# Altium footprint library MS-Electronic.PcbLib: 202 footprints (part 2 of 13)
Each footprint in its own frame and in the unit in brackets; x right, y up, seen from the top. Pads: shape width x height; smd on the part's side, far side on the other; paste and mask are expansions set on the pad; w line width, h text height; cw(c..) or ccw(c..) is an arc to the next point about the centre after c.
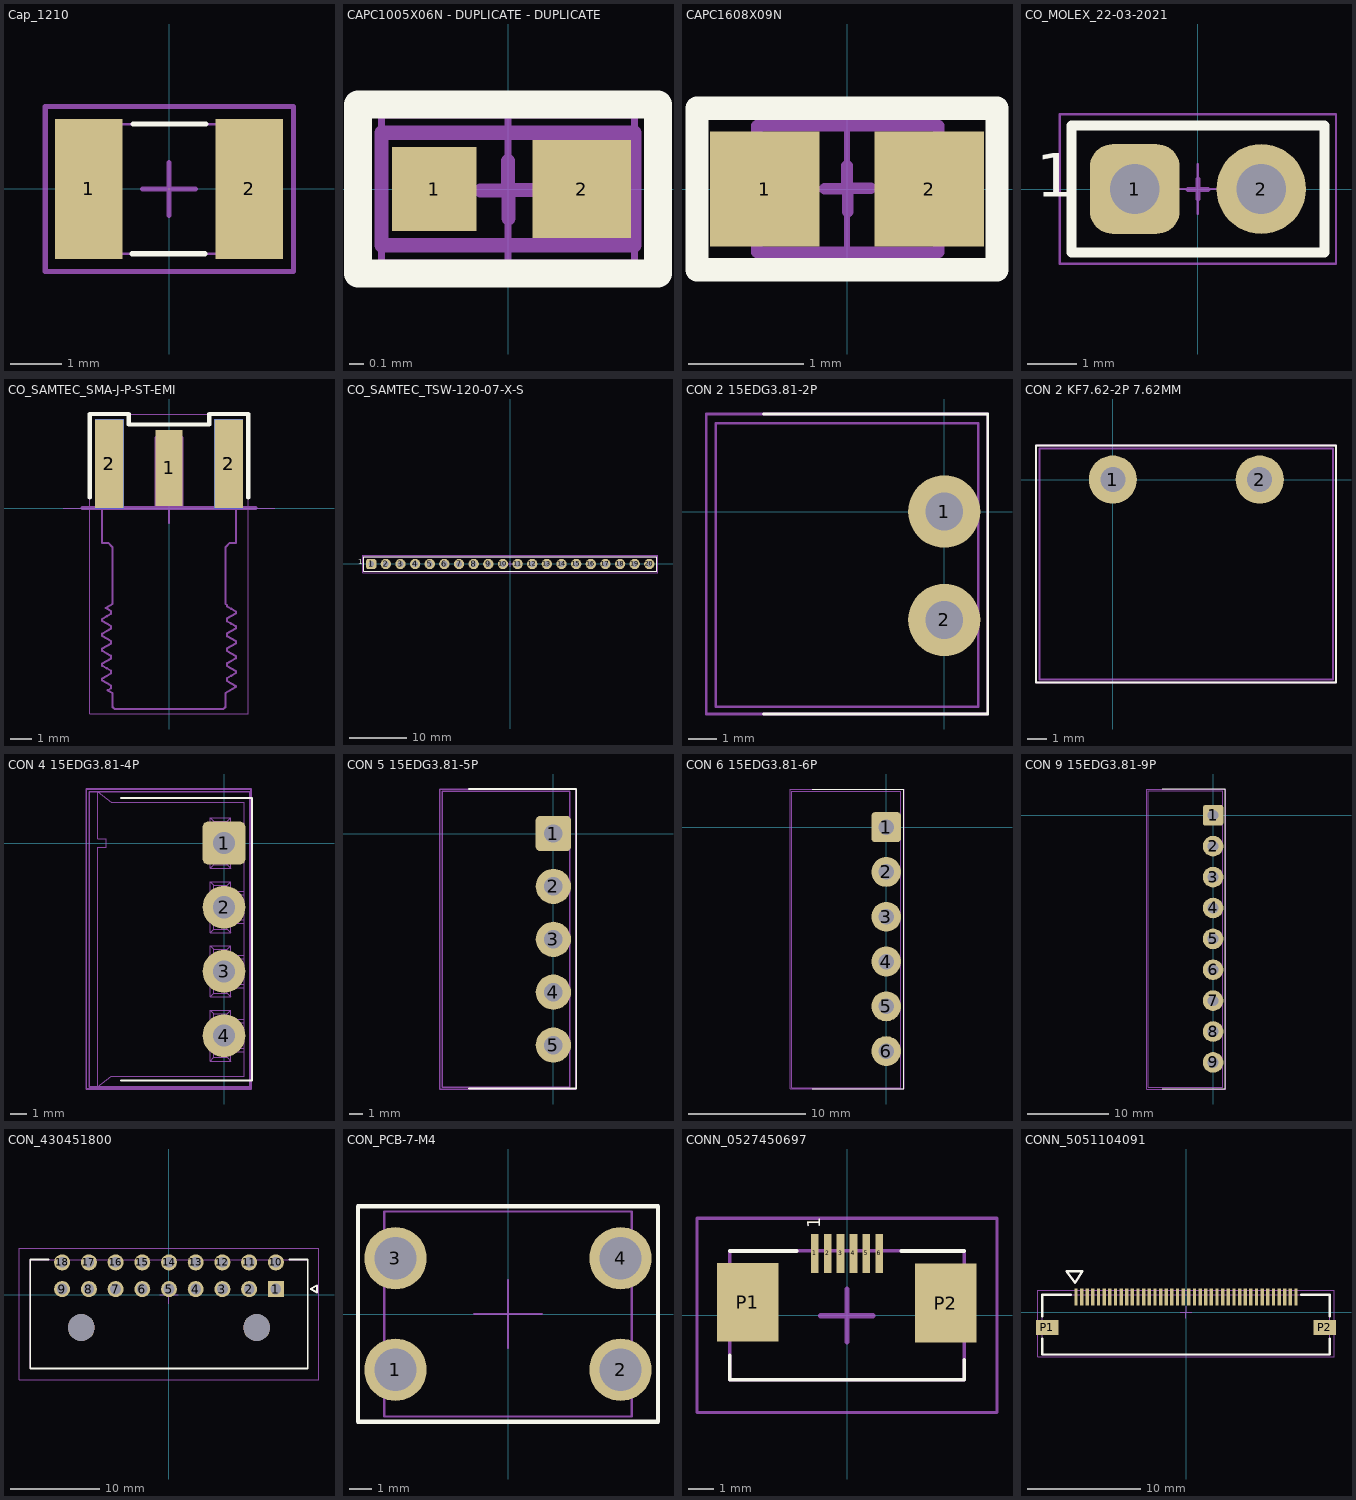
[diagram p1: the footprints below, top view; thin cyan lines are the x and y axes]

## Cap_1210 [mm] "Capacitor 1210"
pads (2):
  rect 1.3x2.7 smd mask+0.1: 1(-1.55,0) 2(1.55,0)
Top Overlay:
  lines w0.1: -0.711,-1.254 0.698,-1.254 ; -0.698,1.254 0.711,1.254
Top Assembly:
  lines w0.05: -1.6,-1.25 -1.6,1.25 1.6,1.25 1.6,-1.25 -1.6,-1.25
  text ".Designator" at -2.499,-0.167 h0.5
Top Component Center (Mech15):
  lines w0.1: -0.508,0 0,0 ; 0,-0.508 0,0 ; 0,0.508 0,0 ; 0.508,0 0,0 ; -2.391,-1.595 2.404,-1.595 2.404,1.593 -2.391,1.593 -2.391,-1.595
3D body "CAP1210a.step": height 1.1, standoff 0, extent -1.64,-1.25 1.64,1.25

## CAPC1005X06N - DUPLICATE - DUPLICATE [mm] "Chip Capacitor, 2-Leads, Body 1.00x0.70x0.70mm (0402)"
height 0.6
pads (2):
  rect 0.6x0.6 smd: 1(-0.525,0)
  rect 0.7x0.7 smd: 2(0.525,0)
Top Overlay:
  lines w0.2: -1.067,-0.6 -1.067,0.6 1.067,0.6 1.067,-0.6 -1.067,-0.6
Top Assembly:
  lines w0.1: -0.9,-0.4 0.9,-0.4 0.9,0.4 -0.9,0.4 -0.9,-0.4
  text ".Designator" at -1.999,-0.133 h0.4
Top Component Center (Mech15):
  lines w0.1: -0.195,-0.01 0.005,-0.01 ; 0,0 0,0.2 ; 0.002,-0.007 0.202,-0.007 ; 0.003,-0.208 0.003,-0.008 ; -1.067,-0.6 1.067,-0.6 1.067,0.6 -1.067,0.6 -1.067,-0.6
Mechanical 17:
  lines w0.05: -0.5,0 0.5,0 ; 0,-0.5 0,0.5 ; -0.9,-0.525 -0.9,0.525 0.9,0.525 0.9,-0.525 -0.9,-0.525
3D body "CAPC1005X06.step": height 0.6, standoff 0, extent -0.5,-0.25 0.5,0.25

## CAPC1608X09N [mm] "Chip Capacitor, 2-Leads, Body 1.60x0.80x0.90mm (0603)"
height 0.9
pads (2):
  rect 0.95x1 smd: 1(-0.713,0) 2(0.713,0)
Top Overlay:
  lines w0.2: -1.3,-0.7 1.3,-0.7 1.3,0.7 -1.3,0.7 -1.3,-0.7
Top Assembly:
  lines w0.1: -0.78,-0.55 -0.78,0.55 0.796,0.55 0.796,-0.55 -0.78,-0.55
  text ".Designator" at -2.499,-0.167 h0.5
Top Component Center (Mech15):
  lines w0.1: -0.194,0.001 0.006,0.001 ; 0,0 0,0.2 ; 0.006,-0.196 0.006,0.004 ; 0.006,0.008 0.206,0.008 ; 1.3,-0.7 1.3,-0.7 ; 1.3,-0.7 1.3,0.7 -1.3,0.7 -1.3,-0.7 1.3,-0.7
Mechanical 17:
  lines w0.05: -0.5,0 0.5,0 ; 0,-0.5 0,0.5 ; -1.3,-0.7 -1.3,0.7 1.3,0.7 1.3,-0.7 -1.3,-0.7
3D body "CAPC1608X09.step": height 0.9, standoff 0, extent -0.8,-0.4 0.8,0.4

## CO_MOLEX_22-03-2021 [mm]
height 10.8
pads (2):
  rrect50% 1.8x1.8 hole 1: 1(-1.27,0)
  round 1.8 hole 1: 2(1.27,0)
Top Overlay:
  lines w0.2: -2.54,-1.27 2.54,-1.27 2.54,1.27 -2.54,1.27 -2.54,-1.27
  text "1" at -3.25,-0.45 h1.5
Top Assembly:
  lines w0.1: -2.54,-1.27 -2.54,1.27 2.54,1.27 2.54,-1.27 -2.54,-1.27
  text ".Designator" at -2.499,-0.167 h0.5
Bottom 3D Body:
  lines w0.1: -2.54,-1.27 2.54,-1.27 2.54,1.27 -2.54,1.27 -2.54,-1.27
  text "1" at -1.6,-1.85 h1.25
Top Component Center (Mech15):
  lines w0.1: -0.2,-0.01 0.004,-0.01 ; -0.002,-0.007 0.2,-0.007 ; 0,0 0,0.2 ; 0.001,-0.2 0.001,-0.007 ; -2.54,-1.27 -2.54,1.27 2.54,1.27 2.54,-1.27 -2.54,-1.27
Mechanical 17:
  lines w0.05: -0.5,0 0.5,0 ; 0,-0.5 0,0.5 ; -2.77,-1.5 -2.77,1.5 2.77,1.5 2.77,-1.5 -2.77,-1.5
3D body "022032021.stp": height 10.79, standoff -3.43, extent -2.413,-1.181 2.413,1.181

## CO_SAMTEC_SMA-J-P-ST-EMI [mm] "SMA Jack CMS, Edge Mountt Receptacle 50Ohm, 5-Leads, Body 6.35x6.35x9.52mm, pitch 2.825mm"
height 6.35
pads (5):
  rect 1.27x3.6 smd mask+0.05: 1(0,1.9)
  rect 1.35x4.2 smd mask+0.05: 2(-2.825,2.1) 2(2.825,2.1)
  rect 1.35x4.2 smd far side mask+0.05: 2(-2.825,2.1) 2(2.825,2.1)
Top Overlay:
  lines w0.2: -3.75,0.5 -3.75,4.45 -1.9,4.45 -1.9,3.95 1.9,3.95 1.9,4.45 3.75,4.45 3.75,0.5
Top Assembly:
  lines w0.1: -3.164,-8.074 -3.164,-8.162 -3.15,-8.169 ; -3.164,-7.369 -3.164,-7.456 -3.15,-7.464 ; -3.164,-6.663 -3.164,-6.751 -3.15,-6.758 ; -3.164,-5.958 -3.164,-6.045 -3.151,-6.052 ; -3.164,-5.252 -3.164,-5.34 -3.152,-5.346 ; -3.158,-6.052 -2.948,-6.173 -2.744,-6.291 ; -3.159,-5.951 -2.949,-5.829 -2.739,-5.708 ; -3.159,-5.346 -2.949,-5.468 -2.744,-5.586 ; -3.158,-5.245 -2.948,-5.124 -2.738,-5.002 ; -3.157,-8.169 -2.947,-8.291 -2.744,-8.408 ; -3.157,-8.067 -2.947,-7.945 -2.737,-7.823 ; -3.157,-7.464 -2.947,-7.585 -2.744,-7.703 ; -3.157,-7.361 -2.947,-7.24 -2.737,-7.118 ; -3.157,-6.758 -2.947,-6.88 -2.744,-6.997 ; -3.157,-6.656 -2.947,-6.534 -2.737,-6.413 ; -2.992,-4.737 -2.947,-4.763 -2.744,-4.88 ; -2.991,-4.732 -2.675,-4.55 -2.675,-1.85 -2.875,-1.65 -3.175,-1.65 -3.175,0 -3.175,3.81 -2.365,3.81 -2.365,0 -0.635,0 -0.635,3.335 -0.335,3.635 0,3.635 0.335,3.635 0.635,3.335 0.635,0 2.365,0 2.365,3.81 3.175,3.81 3.175,0 3.175,-1.65 2.875,-1.65 2.675,-1.85 2.675,-4.55 2.744,-4.59 2.744,-4.653 2.947,-4.77 3.157,-4.892 ; -2.9,-8.63 -2.675,-8.76 -2.675,-9.42 -2.575,-9.52 0,-9.52 2.575,-9.52 2.675,-9.42 2.675,-8.76 3.164,-8.478 3.164,-8.427 3.152,-8.42 ; -2.901,-8.624 -2.737,-8.529 ; -2.744,-8.533 -2.744,-8.404 ; -2.744,-7.828 -2.744,-7.698 ; -2.744,-7.122 -2.744,-6.993 ; -2.744,-6.417 -2.744,-6.287 ; -2.744,-5.711 -2.744,-5.582 ; -2.744,-5.006 -2.744,-4.876 ; 2.737,-7.354 2.947,-7.232 3.157,-7.111 ; 2.737,-6.649 2.947,-6.527 3.157,-6.406 ; 2.737,-5.943 2.947,-5.822 3.157,-5.7 ; 2.737,-5.237 2.947,-5.116 3.157,-4.994 ; 2.739,-8.059 2.949,-7.937 3.159,-7.816 ; 2.744,-8.185 2.744,-8.055 ; 2.744,-8.181 2.949,-8.299 3.159,-8.42 ; 2.744,-7.479 2.744,-7.35 ; 2.744,-7.475 2.948,-7.593 3.158,-7.715 ; 2.744,-6.774 2.744,-6.644 ; 2.744,-6.77 2.947,-6.887 3.157,-7.008 ; 2.744,-6.068 2.744,-5.939 ; 2.744,-6.064 2.947,-6.181 3.157,-6.303 ; 2.744,-5.363 2.744,-5.233 ; 2.744,-5.358 2.947,-5.476 3.157,-5.597 ; 3.15,-7.008 3.164,-7.016 3.164,-7.104 ; 3.15,-6.303 3.164,-6.31 3.164,-6.398 ; 3.15,-5.597 3.164,-5.605 3.164,-5.692 ; 3.151,-7.715 3.164,-7.721 3.164,-7.809 ; 3.151,-4.892 3.164,-4.899 3.164,-4.987
  lines w0.2: -4.1,0 4.1,0
  text ".Designator" at 0.167,-2.499 h0.5
Top Component Center (Mech15):
  lines w0.1: -3.164,-8.074 -3.164,-8.162 -3.15,-8.169 ; -3.164,-7.369 -3.164,-7.456 -3.15,-7.464 ; -3.164,-6.663 -3.164,-6.751 -3.15,-6.758 ; -3.164,-5.958 -3.164,-6.045 -3.151,-6.052 ; -3.164,-5.252 -3.164,-5.34 -3.152,-5.346 ; -3.158,-6.052 -2.948,-6.173 -2.744,-6.291 ; -3.159,-5.951 -2.949,-5.829 -2.739,-5.708 ; -3.159,-5.346 -2.949,-5.468 -2.744,-5.586 ; -3.158,-5.245 -2.948,-5.124 -2.738,-5.002 ; -3.157,-8.169 -2.947,-8.291 -2.744,-8.408 ; -3.157,-8.067 -2.947,-7.945 -2.737,-7.823 ; -3.157,-7.464 -2.947,-7.585 -2.744,-7.703 ; -3.157,-7.361 -2.947,-7.24 -2.737,-7.118 ; -3.157,-6.758 -2.947,-6.88 -2.744,-6.997 ; -3.157,-6.656 -2.947,-6.534 -2.737,-6.413 ; -2.992,-4.737 -2.947,-4.763 -2.744,-4.88 ; -2.991,-4.732 -2.675,-4.55 -2.675,-1.85 -2.875,-1.65 -3.175,-1.65 -3.175,0 -3.175,3.81 -2.365,3.81 -2.365,0 -0.635,0 -0.635,3.335 -0.335,3.635 0,3.635 0.335,3.635 0.635,3.335 0.635,0 2.365,0 2.365,3.81 3.175,3.81 3.175,0 3.175,-1.65 2.875,-1.65 2.675,-1.85 2.675,-4.55 2.744,-4.59 2.744,-4.653 2.947,-4.77 3.157,-4.892 ; -2.9,-8.63 -2.675,-8.76 -2.675,-9.42 -2.575,-9.52 0,-9.52 2.575,-9.52 2.675,-9.42 2.675,-8.76 3.164,-8.478 3.164,-8.427 3.152,-8.42 ; -2.901,-8.624 -2.737,-8.529 ; -2.744,-8.533 -2.744,-8.404 ; -2.744,-7.828 -2.744,-7.698 ; -2.744,-7.122 -2.744,-6.993 ; -2.744,-6.417 -2.744,-6.287 ; -2.744,-5.711 -2.744,-5.582 ; -2.744,-5.006 -2.744,-4.876 ; -0.708,-0.004 -0.008,-0.004 ; 0,-0.7 0,0 0,0.7 ; 0.017,-0.004 0.717,-0.004 ; 2.737,-7.354 2.947,-7.232 3.157,-7.111 ; 2.737,-6.649 2.947,-6.527 3.157,-6.406 ; 2.737,-5.943 2.947,-5.822 3.157,-5.7 ; 2.737,-5.237 2.947,-5.116 3.157,-4.994 ; 2.739,-8.059 2.949,-7.937 3.159,-7.816 ; 2.744,-8.185 2.744,-8.055 ; 2.744,-8.181 2.949,-8.299 3.159,-8.42 ; 2.744,-7.479 2.744,-7.35 ; 2.744,-7.475 2.948,-7.593 3.158,-7.715 ; 2.744,-6.774 2.744,-6.644 ; 2.744,-6.77 2.947,-6.887 3.157,-7.008 ; 2.744,-6.068 2.744,-5.939 ; 2.744,-6.064 2.947,-6.181 3.157,-6.303 ; 2.744,-5.363 2.744,-5.233 ; 2.744,-5.358 2.947,-5.476 3.157,-5.597 ; 3.15,-7.008 3.164,-7.016 3.164,-7.104 ; 3.15,-6.303 3.164,-6.31 3.164,-6.398 ; 3.15,-5.597 3.164,-5.605 3.164,-5.692 ; 3.151,-7.715 3.164,-7.721 3.164,-7.809 ; 3.151,-4.892 3.164,-4.899 3.164,-4.987
  lines w0.2: -4.1,0 4.1,0
Bottom Component Center:
  lines w0.01: -5,0 5,0
Mechanical 17:
  lines w0.05: -0.5,0 0.5,0 ; 0,-0.5 0,0.5 ; 3.73,4.43 -3.75,4.43 -3.75,-9.75 3.75,-9.75 3.75,4.43
3D body "SAMTEC_SMA-J-P-H-ST-EM1.stp": height 3.8, standoff -2.55, extent -3.175,-10.133 3.175,3.197

## CO_SAMTEC_TSW-120-07-X-S [mm] "Header, 20-Leads, 50.80x2.54x10.80mm, Pitch 2.54mm"
height 10.8
pads (20):
  rrect50% 1.8x1.8 hole 1: 1(-24.13,0)
  round 1.8 hole 1: 2(-21.59,0) 3(-19.05,0) 4(-16.51,0) 5(-13.97,0) 6(-11.43,0) 7(-8.89,0) 8(-6.35,0) 9(-3.81,0) 10(-1.27,0) 11(1.27,0) 12(3.81,0) 13(6.35,0) 14(8.89,0) 15(11.43,0) 16(13.97,0) 17(16.51,0) 18(19.05,0) 19(21.59,0) 20(24.13,0)
Top Overlay:
  lines w0.2: -25.4,-1.27 -25.4,1.27 25.4,1.27 25.4,-1.27 -25.4,-1.27
  text "1" at -26.416,-0.381 h1.5
Bottom Overlay:
  lines w0.2: -25.4,-1.27 -25.4,1.27 25.4,1.27 25.4,-1.27 -25.4,-1.27
  text "1" at -26.066,-0.376 h1.5
Top Assembly:
  lines w0.2: -25.4,-1.27 -25.4,1.27 25.4,1.27 25.4,-1.27 -25.4,-1.27
  text ".Designator" at -2.499,-0.167 h0.5
Bottom 3D Body:
  lines w0.1: -25.4,-1.27 -25.4,1.27 25.4,1.27 25.4,-1.27 -25.4,-1.27
  text "1" at -26.416,-0.381 h1.5
Top Component Center (Mech15):
  lines w0.1: -0.3,0 0,0 ; -0.001,0 0.299,0 ; 0,-0.3 0,0 ; 0,0.3 0,0
  lines w0.2: -25.4,-1.27 -25.4,1.27 25.4,1.27 25.4,-1.27 -25.4,-1.27
Mechanical 17:
  lines w0.05: -0.5,0 0.5,0 ; 0,-0.5 0,0.5 ; -25.63,-1.52 25.63,-1.52 25.63,1.52 -25.63,1.52 -25.63,-1.52
3D body "SAMTEC_TSW-120-07-G-S.stp": height 8.38, standoff -2.54, extent -25.464,-1.27 25.463,1.27

## CON 2 15EDG3.81-2P [mil]
pads (2):
  round 100 hole 52: 1(0,0) 2(0,-150)
Top Overlay:
  lines w3.94: -250,-280 60,-280 60,134.83 -250,134.83
Top Assembly:
  lines w3.94: -316,-270 47,-270 47,122 -316,122 -316,-270
  text ".Designator" at -118.07,-7.87 h23.62
Top Component Center (Mech15):
  lines w3.94: -40,0 0,0 ; 0,-40 0,0 ; 0,40 0,0 ; 40,0 0,0 ; -329.12,-280 60,-280 60,134.89 -329.12,134.89 -329.12,-280
3D body "284513-2.stp": height 287.4, standoff -133.86, extent -314.96,-268.11 47.24,122.05

## CON 2 KF7.62-2P 7.62MM [mm]
pads (2):
  round 2.5 hole 1.3: 1(0,0) 2(7.62,0)
Top Overlay:
  lines w0.1: -3.988,-10.531 11.581,-10.531 11.581,1.772 -3.988,1.772 -3.988,-10.531
Top Assembly:
  lines w0.1: -3.809,-10.382 11.43,-10.382 11.43,1.604 -3.809,1.604 -3.809,-10.382
  text ".Designator" at -2.499,-0.167 h0.5
Top Component Center (Mech15):
  lines w0.1: -1.041,0 0,0 ; 0,-1.041 0,0 ; 0,1.041 0,0 ; 1.041,0 0,0 ; -3.988,-10.531 11.581,-10.531 11.581,1.772 -3.988,1.772 -3.988,-10.531
3D body "KF7_62-2P.STEP": height 12.4, standoff -6.3, extent -3.81,-10.394 11.43,1.606

## CON 4 15EDG3.81-4P [mil] "TERM BLOCK HDR 4POS 3.81MM RIGHT-ANGLE"
height 362.2
pads (4):
  rrect25% 100x100 hole 52: 1(0,0)
  round 100 hole 52: 2(0,-150) 3(0,-300) 4(0,-450)
Top Overlay:
  lines w5: -240,-555 65,-555 65,105 -240,105
Top Assembly:
  lines w3.94: -314.96,-570 -314.96,120.08 60,120.08 60,-570 -314.96,-570
  text ".Designator" at -118.07,-7.87 h23.62
Top 3D Body:
  lines w1.97: 47.24,-487.8 7.87,-487.8 ; 47.24,-479.53 16.14,-479.53 ; 47.24,-420.47 16.14,-420.47 ; 47.24,-412.2 7.87,-412.2 ; 47.24,-337.8 7.87,-337.8 ; 47.24,-329.53 16.14,-329.53 ; 47.24,-270.47 16.14,-270.47 ; 47.24,-262.2 7.87,-262.2 ; 47.24,-187.8 7.87,-187.8 ; 47.24,-179.53 16.14,-179.53 ; 47.24,-120.47 16.14,-120.47 ; 47.24,-112.2 7.87,-112.2 ; 47.24,-37.8 7.87,-37.8 ; 47.24,-29.53 16.14,-29.53 ; 47.24,29.53 16.14,29.53 ; 47.24,37.8 7.87,37.8 ; -295.28,-570.08 -263.78,-544.88 47.24,-544.88 47.24,94.88 -263.78,94.88 -295.28,120.08 ; -295.28,-570.08 -295.28,-9.84 -275.59,-9.84 -275.59,9.84 -295.28,9.84 -295.28,120.08 ; -295.28,-570.08 -314.96,-570.08 -314.96,120.08 -295.28,120.08 ; -31.89,-509.45 -31.89,-390.55 ; -31.89,-509.45 -23.62,-501.18 ; -31.89,-509.45 16.14,-509.45 ; -31.89,-390.55 -23.62,-398.82 ; -31.89,-390.55 16.14,-390.55 ; -31.89,-359.45 -23.62,-351.18 ; -31.89,-359.45 16.14,-359.45 ; -31.89,-359.45 -31.89,-240.55 ; -31.89,-240.55 -23.62,-248.82 ; -31.89,-240.55 16.14,-240.55 ; -31.89,-209.45 -23.62,-201.18 ; -31.89,-209.45 16.14,-209.45 ; -31.89,-209.45 -31.89,-90.55 ; -31.89,-90.55 -23.62,-98.82 ; -31.89,-90.55 16.14,-90.55 ; -31.89,-59.45 -23.62,-51.18 ; -31.89,-59.45 16.14,-59.45 ; -31.89,-59.45 -31.89,59.45 ; -31.89,59.45 -23.62,51.18 ; -31.89,59.45 16.14,59.45 ; -23.62,-501.18 -23.62,-398.82 ; -23.62,-501.18 7.87,-501.18 ; -23.62,-398.82 7.87,-398.82 ; -23.62,-351.18 7.87,-351.18 ; -23.62,-351.18 -23.62,-248.82 ; -23.62,-248.82 7.87,-248.82 ; -23.62,-201.18 -23.62,-98.82 ; -23.62,-201.18 7.87,-201.18 ; -23.62,-98.82 7.87,-98.82 ; -23.62,-51.18 -23.62,51.18 ; -23.62,-51.18 7.87,-51.18 ; -23.62,51.18 7.87,51.18 ; 7.87,-501.18 7.87,-487.8 ; 7.87,-501.18 16.14,-509.45 ; 7.87,-487.8 cw(c16.14,-487.8) 16.14,-479.53 ; 7.87,-412.2 ccw(c16.14,-412.2) 16.14,-420.47 ; 7.87,-412.2 7.87,-398.82 ; 7.87,-398.82 16.14,-390.55 ; 7.87,-351.18 7.87,-337.8 ; 7.87,-351.18 16.14,-359.45 ; 7.87,-337.8 cw(c16.14,-337.8) 16.14,-329.53 ; 7.87,-262.2 ccw(c16.14,-262.2) 16.14,-270.47 ; 7.87,-262.2 7.87,-248.82 ; 7.87,-248.82 16.14,-240.55 ; 7.87,-201.18 7.87,-187.8 ; 7.87,-201.18 16.14,-209.45 ; 7.87,-187.8 cw(c16.14,-187.8) 16.14,-179.53 ; 7.87,-112.2 ccw(c16.14,-112.2) 16.14,-120.47 ; 7.87,-112.2 7.87,-98.82 ; 7.87,-98.82 16.14,-90.55 ; 7.87,-51.18 7.87,-37.8 ; 7.87,-51.18 16.14,-59.45 ; 7.87,-37.8 cw(c16.14,-37.8) 16.14,-29.53 ; 7.87,37.8 ccw(c16.14,37.8) 16.14,29.53 ; 7.87,37.8 7.87,51.18 ; 7.87,51.18 16.14,59.45 ; 16.14,-509.45 16.14,-479.53 ; 16.14,-420.47 16.14,-390.55 ; 16.14,-359.45 16.14,-329.53 ; 16.14,-270.47 16.14,-240.55 ; 16.14,-209.45 16.14,-179.53 ; 16.14,-120.47 16.14,-90.55 ; 16.14,-59.45 16.14,-29.53 ; 16.14,29.53 16.14,59.45
Top Component Center (Mech15):
  lines w3.94: -30,0 0,0 ; 0,-30 0,0 ; 0,30 0,0 ; 30,0 0,0 ; -322.05,-574.8 62.99,-574.8 62.99,126.21 -322.05,126.21 -322.05,-574.8
3D body "CONN RA HEADER TE 4P.STEP": height 291.34, standoff -129.92, extent -314.95,-570.07 47.25,120.08

## CON 5 15EDG3.81-5P [mil] "TERM BLOCK HDR 5POS 3.81MM RIGHT-ANGLE"
height 362.2
pads (5):
  rrect25% 100x100 hole 52: 1(0,0)
  round 100 hole 52: 2(0,-150) 3(0,-300) 4(0,-450) 5(0,-600)
Top Overlay:
  lines w5: -240,-723 65,-723 65,126 -240,126
Top Assembly:
  lines w3.94: -314.96,-719 47,-719 47,120.08 -314.96,120.08 -314.96,-719
  text ".Designator" at -118.07,-7.87 h23.62
Top Component Center (Mech15):
  lines w3.94: -30,0 0,0 ; 0,-30 0,0 ; 0,30 0,0 ; 30,0 0,0 ; -322.05,-724.52 -322.05,126.21 62.99,126.21 62.99,-724.52 -322.05,-724.52
3D body "284513-5.stp": height 287.4, standoff -133.86, extent -315.1,-719.16 47.1,121

## CON 6 15EDG3.81-6P [mil]
pads (6):
  rrect25% 100x100 hole 52: 1(0,0)
  round 100 hole 52: 2(0,-150) 3(0,-300) 4(0,-450) 5(0,-600) 6(0,-750)
Top Overlay:
  lines w3.94: -247.78,-876.87 59.3,-876.87 59.3,127.74 -247.78,127.74
Top Assembly:
  lines w3.94: -315.59,-872 49,-872 49,119.76 -315.59,119.76 -315.59,-872
  text ".Designator" at -118.07,-7.87 h23.62
Top Component Center (Mech15):
  lines w3.94: -30,0 0,0 ; 0,-30 0,0 ; 0,30 0,0 ; 30,0 0,0 ; -322.05,-876.76 -322.05,127.64 59.05,127.64 59.06,-876.76 -322.05,-876.76
3D body "c-284513-6-c-3d.stp": height 287.4, standoff -133.86, extent -313.1,-872.16 49.1,118

## CON 9 15EDG3.81-9P [mil]
pads (9):
  rrect25% 100x100 hole 52: 1(0,0)
  round 100 hole 52: 2(0,-150) 3(0,-300) 4(0,-450) 5(0,-600) 6(0,-750) 7(0,-900) 8(0,-1050) 9(0,-1200)
Top Overlay:
  lines w3.94: -247.78,-1328.96 59.3,-1328.96 59.3,127.74 -247.78,127.74
Top Assembly:
  lines w3.94: -315.59,-1321.18 46.61,-1321.18 46.61,119.76 -315.59,119.76 -315.59,-1321.18
  text ".Designator" at -118.07,-7.87 h23.62
Top Component Center (Mech15):
  lines w3.94: -30,0 0,0 ; 0,-30 0,0 ; 0,30 0,0 ; 30,0 0,0 ; -322.05,-1329.06 59.06,-1329.06 59.05,127.64 -322.05,127.64 -322.05,-1329.06
3D body "284513-9.stp": height 287.4, standoff -133.86, extent -314.96,-1320.08 47.24,120.08

## CON_430451800 [mm]
height 8.77
pads (20):
  rect 1.8x1.8 hole 1.2 mask+0.076: 1(12,0.66)
  round 1.8 hole 1.2 mask+0.076: 2(9,0.66) 3(6,0.66) 4(3,0.66) 5(0,0.66) 6(-3,0.66) 7(-6,0.66) 8(-9,0.66) 9(-12,0.66) 10(12,3.66) 11(9,3.66) 12(6,3.66) 13(3,3.66) 14(0,3.66) 15(-3,3.66) 16(-6,3.66) 17(-9,3.66) 18(-12,3.66)
  round 3 hole 3 unplated mask+0.076: ""(-9.85,-3.66) ""(9.85,-3.66)
Top Overlay:
  lines w0.2: -13.5,3.98 -15.575,3.98 -15.575,-8.26 15.575,-8.26 15.575,3.98 13.5,3.98 ; 15.92,0.67 16.62,0.27 16.62,1.07 15.92,0.67
Top Assembly:
  lines w0.1: -15.575,-8.26 -15.575,3.98 15.575,3.98 15.575,-8.26 -15.575,-8.26 ; 15.92,0.67 16.62,0.27 16.62,1.07 15.92,0.67
  text ".Designator" at -4.998,-0.333 h1
Top Component Center (Mech15):
  lines w0.1: -1.016,0 0,0 ; 0,-1.016 0,0 ; 0,1.016 0,0 ; 1.016,0 0,0 ; -16.845,-9.53 -16.845,5.25 16.845,5.25 16.845,-9.53 -16.845,-9.53
3D body "0430451800.stp": height 8.83, standoff -3.12, extent -15.64,-8.257 15.51,3.983

## CON_PCB-7-M4 [mm]
pads (4):
  round 2.8 hole 1.9: 1(-5.05,-2.5) 2(5.05,-2.5) 3(-5.05,2.5) 4(5.05,2.5)
Top Overlay:
  lines w0.2: -6.731,-4.826 6.731,-4.826 6.731,4.826 -6.731,4.826 -6.731,-4.826
Top Assembly:
  lines w0.1: -5.55,-4.6 5.55,-4.6 5.55,4.6 -5.55,4.6 -5.55,-4.6
  text ".Designator" at -4.998,-0.333 h1
Top Component Center (Mech15):
  lines w0.1: -1.524,0 0,0 ; 0,-1.524 0,0 ; 0,1.524 0,0 ; 1.524,0 0,0 ; -6.731,-4.826 6.731,-4.826 6.731,4.826 -6.731,4.826 -6.731,-4.826
3D body: height 10.5, standoff 0, extent -5.55,-4.6 5.55,4.6

## CONN_0527450697 [mm]
pads (8):
  rect 0.3x1.5 smd paste+0 mask+0.076: 1(-1.25,2.4) 2(-0.75,2.4) 3(-0.25,2.4) 4(0.25,2.4) 5(0.75,2.4) 6(1.25,2.4)
  rect 2.4x3.05 smd: P1(-3.85,0.5) P2(3.834,0.476)
Top Overlay:
  lines w0.152: -4.55,-1.549 -4.55,-2.5 4.55,-2.5 4.55,-1.727 ; -4.55,2.5 -1.956,2.489 ; 2.108,2.489 4.55,2.5
  text "1" at -1.045,3.371 h0.5
Top Assembly:
  lines w0.127: -4.55,-2.5 4.55,-2.5 4.55,2.5 -4.55,2.5 -4.55,-2.5
  text "'.Designator'" at -3.947,-0.383 h1.78
Top Component Center (Mech15):
  lines w0.127: -5.82,-3.77 5.82,-3.77 5.82,3.77 -5.82,3.77 -5.82,-3.77
  lines w0.2: -1.017,-0.019 -0.001,-0.019 ; -0.005,-1.035 -0.005,-0.019 1.011,-0.019 ; 0,0 0,1.016
3D body "527450697.stp": height 1.91, standoff 0, extent -4.55,-2.502 4.55,2.498

## CONN_5051104091 [mm]
pads (42):
  rect 0.3x1.5 smd paste+0 mask+0.025: 1(-9.75,1.35) 2(-9.25,1.35) 3(-8.75,1.35) 4(-8.25,1.35) 5(-7.75,1.35) 6(-7.25,1.35) 7(-6.75,1.35) 8(-6.25,1.35) 9(-5.75,1.35) 10(-5.25,1.35) 11(-4.75,1.35) 12(-4.25,1.35) 13(-3.75,1.35) 14(-3.25,1.35) 15(-2.75,1.35) 16(-2.25,1.35) 17(-1.75,1.35) 18(-1.25,1.35) 19(-0.75,1.35) 20(-0.25,1.35) 21(0.25,1.35) 22(0.75,1.35) 23(1.25,1.35) 24(1.75,1.35) 25(2.25,1.35) 26(2.75,1.35) 27(3.25,1.35) 28(3.75,1.35) 29(4.25,1.35) 30(4.75,1.35) 31(5.25,1.35) 32(5.75,1.35) 33(6.25,1.35) 34(6.75,1.35) 35(7.25,1.35) 36(7.75,1.35) 37(8.25,1.35) 38(8.75,1.35) 39(9.25,1.35) 40(9.75,1.35)
  rect 2x1.3 smd paste+0 mask+0.025: P1(-12.294,-1.346) P2(12.294,-1.346)
Top Overlay:
  lines w0.2: -12.75,-2.32 -12.75,-3.75 12.75,-3.75 12.75,-2.32 ; -12.75,-0.38 -12.75,1.55 -10.22,1.55 ; 10.22,1.55 12.75,1.55 12.75,-0.38 ; -10.591,3.636 -9.194,3.636 -9.829,2.62 -10.591,3.636
Top Assembly:
  lines w0.1: -12.751,-3.759 12.751,-3.759 12.751,1.549 -12.751,1.549 -12.751,-3.759
  lines w0.127: -10.591,3.636 -9.194,3.636 -9.829,2.62 -10.591,3.636
  text "'.Designator'" at -3.947,-0.383 h1.78
Top Component Center (Mech15):
  lines w0.1: -0.511,0.021 -0.003,0.021 ; 0,-0.508 0,0 ; 0.001,0.016 0.001,0.524 ; 0.006,0.012 0.514,0.012 ; -13.132,-3.937 -13.132,-0.686 -13.132,1.964 13.157,1.964 13.157,-3.937 -13.132,-3.937
3D body "5051104091.stp": height 1.88, standoff -0.02, extent -12.75,-3.746 12.75,1.554